# Altium footprint library connecteurs.PcbLib: 162 footprints (part 2 of 11)
Each footprint in its own frame and in the unit in brackets; x right, y up, seen from the top. Pads: shape width x height; smd on the part's side, far side on the other; paste and mask are expansions set on the pad; w line width, h text height; cw(c..) or ccw(c..) is an arc to the next point about the centre after c.
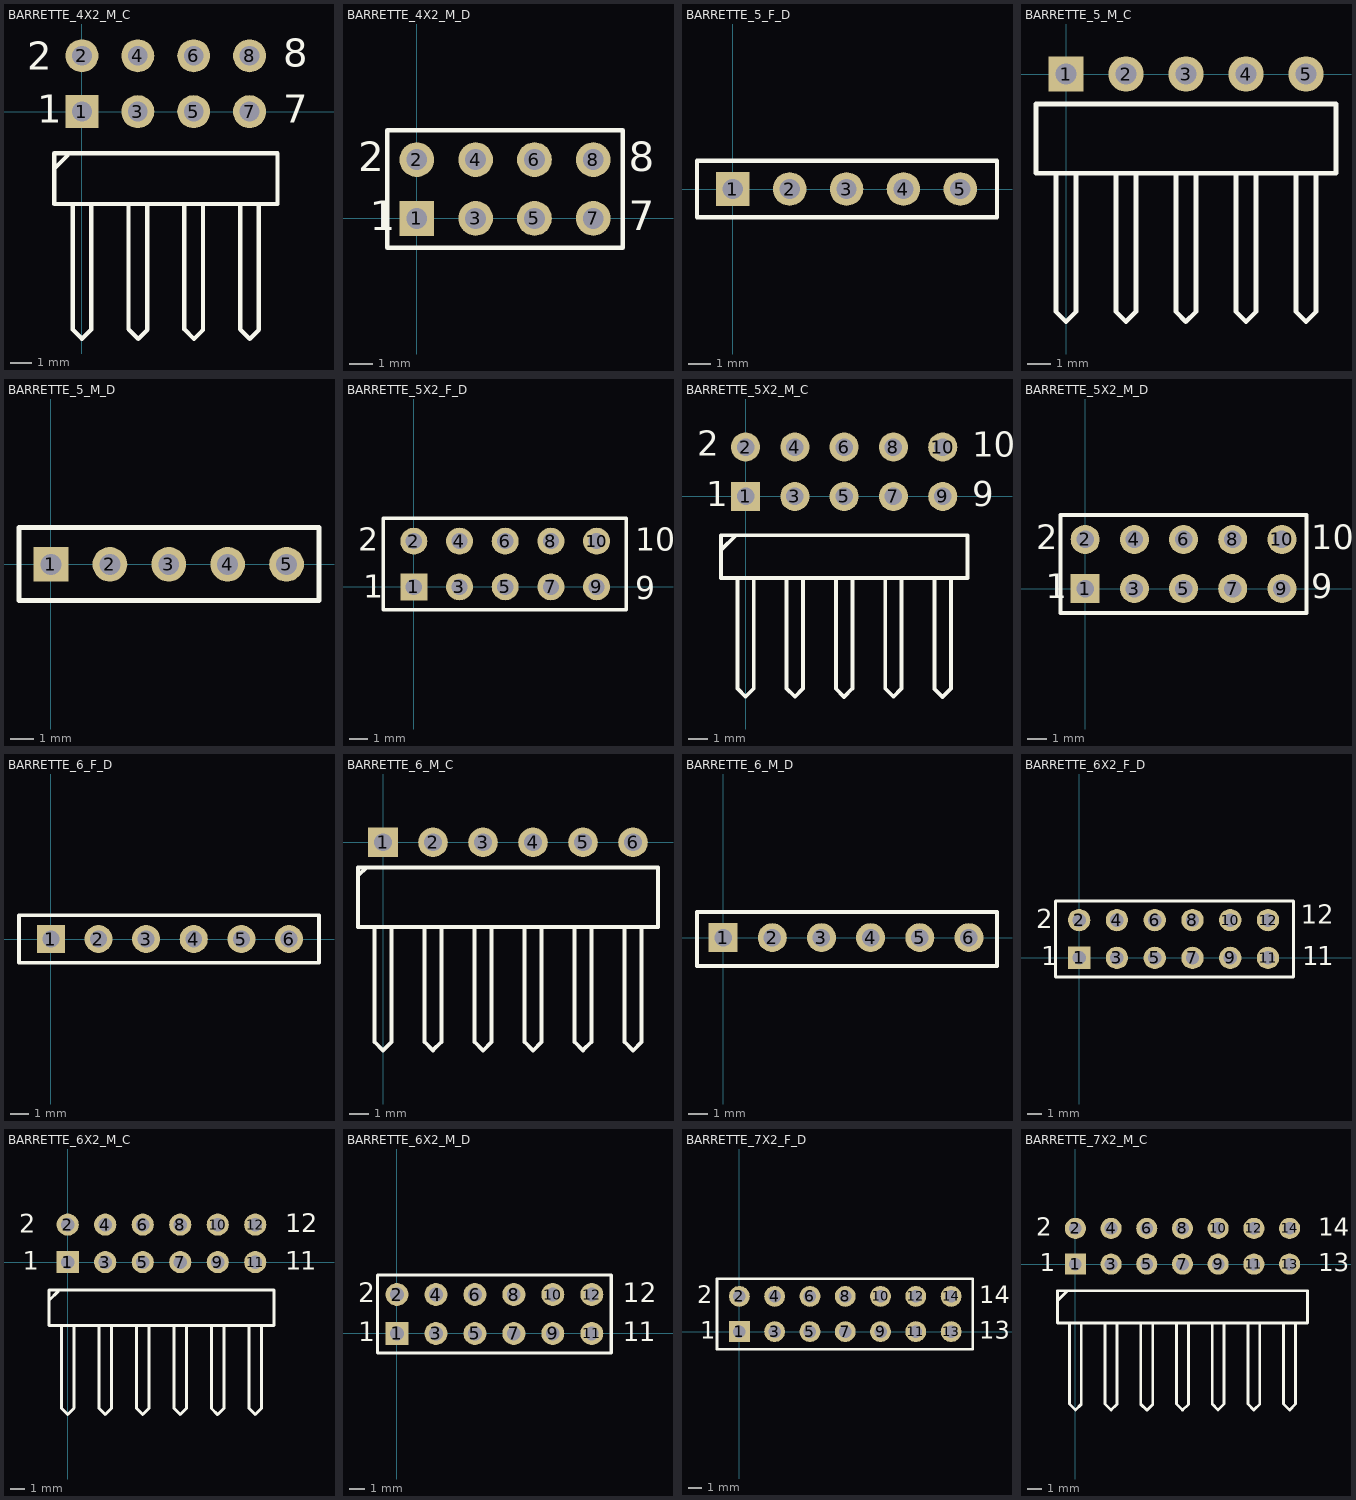
[diagram p1: the footprints below, top view; thin cyan lines are the x and y axes]

## BARRETTE_4X2_M_C [mm] "BARRETTE 4 CONTACTS ; 2 RANGEES ; COUDEE ; MALE ; ESPACEMENT BROCHES = 2.54 mm"
height 5
pads (8):
  rect 1.5x1.5 hole 0.9: 1(0,0)
  round 1.5 hole 0.9: 2(0,2.54) 3(2.54,0) 4(2.54,2.54) 5(5.08,0) 6(5.08,2.54) 7(7.62,0) 8(7.62,2.54)
Top Overlay:
  lines w0.2: -1.27,-2.605 -0.635,-1.97 ; -0.423,-9.907 0,-10.33 ; -0.423,-9.9 -0.423,-4.2 ; -0.003,-10.333 0.42,-9.91 ; 0.423,-9.89 0.423,-4.2 ; 2.117,-9.9 2.117,-4.2 ; 2.12,-9.9 2.555,-10.335 2.963,-9.927 2.963,-4.2 ; 4.657,-9.9 4.657,-4.2 ; 4.66,-9.9 5.095,-10.335 ; 5.092,-10.338 5.5,-9.93 ; 5.503,-9.9 5.503,-4.2 ; 7.195,-9.905 7.63,-10.34 ; 7.197,-9.9 7.197,-4.2 ; 7.632,-10.338 8.043,-9.927 8.043,-4.2 ; -1.27,-4.2 8.89,-4.2 8.89,-1.9 -1.27,-1.9 -1.27,-4.2
  text "2" at -2.5,1.9 h1.27
  text "1" at -2.032,-0.508 h1.27
  text "7" at 9.144,-0.508 h1.27
  text "8" at 9.144,2.032 h1.27
3D body: height 5.64, standoff -2.23, extent -1.3,-9.9 8.86,2.863

## BARRETTE_4X2_M_D [mm] "BARRETTE 4 CONTACTS ; 2 RANGEES ; DROITE ; MALE ; ESPACEMENT BROCHES = 2.54 mm"
height 9.6
pads (8):
  rect 1.5x1.5 hole 0.9: 1(0,0)
  round 1.5 hole 0.9: 2(0,2.54) 3(2.54,0) 4(2.54,2.54) 5(5.08,0) 6(5.08,2.54) 7(7.62,0) 8(7.62,2.54)
Top Overlay:
  lines w0.2: -1.27,-1.27 -1.27,3.81 8.89,3.81 8.89,-1.27 -1.27,-1.27
  text "8" at 9.144,2.032 h1.27
  text "7" at 9.144,-0.508 h1.27
  text "1" at -2.032,-0.508 h1.27
  text "2" at -2.54,2.032 h1.27
3D body: height 10.67, standoff -2.79, extent -1.3,-1.3 8.86,3.78

## BARRETTE_5_F_D [mm] "BARRETTE 5 CONTACTS ; 1 RANGEE ; DROITE ; FEMELLE ; ESPACEMENT BROCHES = 2.54 mm"
height 8.6
pads (5):
  rect 1.5x1.5 hole 0.9: 1(0,0)
  round 1.5 hole 0.9: 2(2.54,0) 3(5.08,0) 4(7.62,0) 5(10.16,0)
Top Overlay:
  lines w0.2: -1.6,-1.27 11.8,-1.27 11.8,1.27 -1.6,1.27 -1.6,-1.27
3D body: height 8.5, standoff -2.65, extent -1.504,-1.2 11.704,1.213

## BARRETTE_5_M_C [mm] "BARRETTE 5 CONTACTS ; 1 RANGEE ; COUDEE ; MALE ; ESPACEMENT BROCHES = 2.54 mm"
height 2.5
pads (5):
  rect 1.5x1.5 hole 0.9: 1(0,0)
  round 1.5 hole 0.9: 2(2.54,0) 3(5.08,0) 4(7.62,0) 5(10.16,0)
Top Overlay:
  lines w0.2: -0.423,-10.06 -0.423,-4.22 ; -0.423,-10.057 0,-10.48 0.423,-10.057 ; 0.423,-10.06 0.423,-4.2 ; 2.117,-10.057 2.54,-10.48 ; 2.117,-10.04 2.117,-4.22 ; 2.537,-10.483 2.96,-10.06 ; 2.963,-10.06 2.963,-4.22 ; 4.657,-4.22 4.657,-10.067 5.075,-10.485 5.503,-10.057 5.503,-4.22 ; 7.197,-10.06 7.197,-4.21 ; 7.197,-10.057 7.62,-10.48 8.043,-10.057 ; 8.043,-10.06 8.043,-4.23 ; 9.737,-10.06 9.737,-4.22 ; 9.737,-10.057 10.16,-10.48 10.583,-10.057 ; 10.583,-10.06 10.583,-4.22 ; -1.27,-4.2 11.43,-4.2 11.43,-1.27 -1.27,-1.27 -1.27,-4.2
3D body: height 2.55, standoff -1.95, extent -1.3,-10.06 11.4,0.26

## BARRETTE_5_M_D [mm] "BARRETTE 5 CONTACTS ; 1 RANGEE ; DROITE ; MALE ; ESPACEMENT BROCHES = 2.54 mm"
height 9.6
pads (5):
  rect 1.5x1.5 hole 0.9: 1(0,0)
  round 1.5 hole 0.9: 2(2.54,0) 3(5.08,0) 4(7.62,0) 5(10.16,0)
Top Overlay:
  lines w0.2: -1.38,-1.56 11.56,-1.56 11.56,1.59 -1.38,1.59 -1.38,-1.56
3D body: height 8.51, standoff -3.68, extent -1.25,-1.42 11.45,1.5

## BARRETTE_5X2_F_D [mm] "BARRETTE 5 CONTACTS ; 2 RANGEES ; DROITE ; FEMELLE ; ESPACEMENT BROCHES = 2.54 mm"
height 8.6
pads (10):
  rect 1.5x1.5 hole 0.9: 1(0,0)
  round 1.5 hole 0.9: 2(0,2.54) 3(2.54,0) 4(2.54,2.54) 5(5.08,0) 6(5.08,2.54) 7(7.62,0) 8(7.62,2.54) 9(10.16,0) 10(10.16,2.54)
Top Overlay:
  lines w0.2: -1.7,-1.27 11.8,-1.27 11.8,3.81 -1.7,3.81 -1.7,-1.27
  text "10" at 12.3,2 h1.27
  text "9" at 12.3,-0.7 h1.27
  text "1" at -2.8,-0.6 h1.27
  text "2" at -3.1,2 h1.27
3D body: height 8.5, standoff -2.65, extent -1.504,-1.253 11.704,3.7

## BARRETTE_5X2_M_C [mm] "BARRETTE 5 CONTACTS ; 2 RANGEES ; COUDEE ; MALE ; ESPACEMENT BROCHES = 2.54 mm"
height 5
pads (10):
  rect 1.5x1.5 hole 0.9: 1(0,0)
  round 1.5 hole 0.9: 2(0,2.54) 3(2.54,0) 4(2.54,2.54) 5(5.08,0) 6(5.08,2.54) 7(7.62,0) 8(7.62,2.54) 9(10.16,0) 10(10.16,2.54)
Top Overlay:
  lines w0.2: -1.235,-2.735 -0.5,-2 ; -0.423,-9.9 -0.423,-4.2 ; -0.42,-9.9 0.003,-10.323 ; 0,-10.32 0.423,-9.897 ; 0.423,-9.9 0.423,-4.2 ; 2.117,-9.9 2.117,-4.2 ; 2.12,-9.9 2.543,-10.323 ; 2.547,-10.323 2.97,-9.9 ; 2.963,-9.9 2.963,-4.2 ; 4.657,-4.2 4.657,-9.907 5.075,-10.325 5.5,-9.9 ; 5.503,-9.9 5.503,-4.2 ; 7.197,-9.9 7.197,-4.2 ; 7.2,-9.9 7.623,-10.323 ; 7.617,-10.323 8.04,-9.9 ; 8.043,-9.9 8.043,-4.243 ; 9.737,-4.2 9.737,-9.927 10.145,-10.335 10.58,-9.9 ; 10.583,-9.9 10.583,-4.2 ; -1.27,-4.2 -1.27,-2 11.43,-2 11.43,-4.2 -1.27,-4.2
  text "10" at 11.684,2.032 h1.27
  text "9" at 11.684,-0.508 h1.27
  text "1" at -2.032,-0.508 h1.27
  text "2" at -2.5,2.1 h1.27
3D body: height 5.64, standoff -2.23, extent -1.3,-9.9 11.4,2.863

## BARRETTE_5X2_M_D [mm] "BARRETTE 5 CONTACTS ; 2 RANGEES ; DROITE ; MALE ; ESPACEMENT BROCHES = 2.54 mm"
height 9.6
pads (10):
  rect 1.5x1.5 hole 0.9: 1(0,0)
  round 1.5 hole 0.9: 2(0,2.54) 3(2.54,0) 4(2.54,2.54) 5(5.08,0) 6(5.08,2.54) 7(7.62,0) 8(7.62,2.54) 9(10.16,0) 10(10.16,2.54)
Top Overlay:
  lines w0.2: -1.27,-1.27 -1.27,3.81 11.43,3.81 11.43,-1.27 -1.27,-1.27
  text "2" at -2.54,2.032 h1.27
  text "1" at -2.032,-0.508 h1.27
  text "9" at 11.684,-0.508 h1.27
  text "10" at 11.684,2.032 h1.27
3D body: height 10.67, standoff -2.79, extent -1.3,-1.24 11.4,3.84

## BARRETTE_6_F_D [mm] "BARRETTE 6 CONTACTS ; 1 RANGEE ; DROITE ; FEMELLE ; ESPACEMENT BROCHES = 2.54 mm"
height 8.6
pads (6):
  rect 1.5x1.5 hole 0.9: 1(0,0)
  round 1.5 hole 0.9: 2(2.54,0) 3(5.08,0) 4(7.62,0) 5(10.16,0) 6(12.7,0)
Top Overlay:
  lines w0.2: -1.7,-1.27 -1.7,1.27 14.3,1.27 14.3,-1.27 -1.7,-1.27
3D body: height 8.5, standoff -2.65, extent -1.574,-1.2 14.174,1.213

## BARRETTE_6_M_C [mm] "BARRETTE 6 CONTACTS ; 1 RANGEE ; COUDEE ; MALE ; ESPACEMENT BROCHES = 2.54 mm"
height 2.5
pads (6):
  rect 1.5x1.5 hole 0.9: 1(0,0)
  round 1.5 hole 0.9: 2(2.54,0) 3(5.08,0) 4(7.62,0) 5(10.16,0) 6(12.7,0)
Top Overlay:
  lines w0.2: -1.27,-1.693 -0.847,-1.27 ; -0.423,-10.14 -0.423,-4.33 ; -0.42,-10.14 0.005,-10.565 0.423,-10.147 0.423,-4.3 ; 2.117,-10.14 2.117,-4.31 ; 2.12,-10.14 2.545,-10.565 ; 2.542,-10.558 2.96,-10.14 ; 2.963,-10.14 2.963,-4.33 ; 4.657,-10.14 4.657,-4.31 ; 4.66,-10.14 5.085,-10.565 ; 5.092,-10.568 5.51,-10.15 ; 5.503,-10.14 5.503,-4.31 ; 7.197,-10.14 7.197,-4.31 ; 7.2,-10.14 7.625,-10.565 ; 7.632,-10.568 8.05,-10.15 ; 8.043,-10.14 8.043,-4.29 ; 9.737,-10.14 9.737,-4.33 ; 9.74,-10.14 10.165,-10.565 ; 10.162,-10.558 10.58,-10.14 ; 10.583,-10.14 10.583,-4.3 ; 12.277,-10.14 12.277,-4.31 ; 12.28,-10.14 12.705,-10.565 ; 12.712,-10.568 13.13,-10.15 ; 13.123,-10.14 13.123,-4.33 ; -1.27,-4.29 -1.27,-1.27 13.97,-1.27 13.97,-4.29 -1.27,-4.29
3D body: height 3.18, standoff -2.2, extent -1.27,-10.14 13.97,0.34

## BARRETTE_6_M_D [mm] "BARRETTE 6 CONTACTS ; 1 RANGEE ; DROITE ; MALE ; ESPACEMENT BROCHES = 2.54 mm"
height 9.6
pads (6):
  rect 1.5x1.5 hole 0.9: 1(0,0)
  round 1.5 hole 0.9: 2(2.54,0) 3(5.08,0) 4(7.62,0) 5(10.16,0) 6(12.7,0)
Top Overlay:
  lines w0.2: -1.35,-1.46 14.15,-1.46 14.15,1.32 -1.35,1.32 -1.35,-1.46
3D body: height 10.1, standoff -1.5, extent -1.22,-1.34 14.02,1.2

## BARRETTE_6X2_F_D [mm] "BARRETTE 6 CONTACTS ; 2 RANGEES ; DROITE ; FEMELLE ; ESPACEMENT BROCHES = 2.54 mm"
height 8.6
pads (12):
  rect 1.5x1.5 hole 0.9: 1(0,0)
  round 1.5 hole 0.9: 2(0,2.54) 3(2.54,0) 4(2.54,2.54) 5(5.08,0) 6(5.08,2.54) 7(7.62,0) 8(7.62,2.54) 9(10.16,0) 10(10.16,2.54) 11(12.7,0) 12(12.7,2.54)
Top Overlay:
  lines w0.2: -1.6,-1.27 -1.6,3.81 14.4,3.81 14.4,-1.27 -1.6,-1.27
  text "2" at -2.9,2 h1.27
  text "1" at -2.54,-0.508 h1.27
  text "1" at 15,-0.5 h1.27
  text "1" at 16,-0.5 h1.27
  text "12" at 14.9,2.3 h1.27
3D body: height 8.5, standoff -2.65, extent -1.444,-1.14 14.304,3.813

## BARRETTE_6X2_M_C [mm] "BARRETTE 6 CONTACTS ; 2 RANGEES ; COUDEE ; MALE ; ESPACEMENT BROCHES = 2.54 mm"
height 5
pads (12):
  rect 1.5x1.5 hole 0.9: 1(0,0)
  round 1.5 hole 0.9: 2(0,2.54) 3(2.54,0) 4(2.54,2.54) 5(5.08,0) 6(5.08,2.54) 7(7.62,0) 8(7.62,2.54) 9(10.16,0) 10(10.16,2.54) 11(12.7,0) 12(12.7,2.54)
Top Overlay:
  lines w0.2: -1.27,-2.605 -0.635,-1.97 ; -0.423,-4.3 -0.423,-9.897 -0.003,-10.317 0.423,-9.89 0.423,-4.3 ; 2.117,-4.3 2.117,-9.9 2.537,-10.32 ; 2.537,-10.327 2.963,-9.9 2.963,-4.3 ; 4.657,-4.4 4.657,-9.9 5.077,-10.32 ; 5.077,-10.327 5.503,-9.9 5.503,-4.3 ; 7.197,-4.3 7.197,-9.9 7.617,-10.32 ; 7.617,-10.327 8.043,-9.9 8.043,-4.3 ; 9.737,-4.3 9.737,-9.91 10.157,-10.33 ; 10.157,-10.327 10.583,-9.9 10.583,-4.3 ; 12.277,-4.3 12.277,-9.9 12.697,-10.32 ; 12.697,-10.327 13.123,-9.9 13.123,-4.3 ; -1.27,-4.3 13.97,-4.3 13.97,-1.9 -1.27,-1.9 -1.27,-4.3
  text "2" at -3.3,2 h1.27
  text "1" at -3.048,-0.508 h1.27
  text "1" at 14.732,-0.508 h1.27
  text "1" at 15.748,-0.508 h1.27
  text "12" at 14.732,2.032 h1.27
3D body: height 5.64, standoff -2.23, extent -1.3,-9.9 13.94,2.863

## BARRETTE_6X2_M_D [mm] "BARRETTE 6 CONTACTS ; 2 RANGEES ; DROITE ; MALE ; ESPACEMENT BROCHES = 2.54 mm"
height 9.6
pads (12):
  rect 1.5x1.5 hole 0.9: 1(0,0)
  round 1.5 hole 0.9: 2(0,2.54) 3(2.54,0) 4(2.54,2.54) 5(5.08,0) 6(5.08,2.54) 7(7.62,0) 8(7.62,2.54) 9(10.16,0) 10(10.16,2.54) 11(12.7,0) 12(12.7,2.54)
Top Overlay:
  lines w0.2: -1.27,-1.27 13.97,-1.27 13.97,3.81 -1.27,3.81 -1.27,-1.27
  text "12" at 14.732,2.032 h1.27
  text "1" at 15.748,-0.508 h1.27
  text "1" at 14.732,-0.508 h1.27
  text "1" at -2.54,-0.508 h1.27
  text "2" at -2.54,2.032 h1.27
3D body: height 10.67, standoff -2.79, extent -1.3,-1.24 13.94,3.84

## BARRETTE_7X2_F_D [mm] "BARRETTE 7 CONTACTS ; 2 RANGEES ; DROITE ; FEMELLE ; ESPACEMENT BROCHES = 2.54 mm"
height 8.6
pads (14):
  rect 1.5x1.5 hole 0.9: 1(0,0)
  round 1.5 hole 0.9: 2(0,2.54) 3(2.54,0) 4(2.54,2.54) 5(5.08,0) 6(5.08,2.54) 7(7.62,0) 8(7.62,2.54) 9(10.16,0) 10(10.16,2.54) 11(12.7,0) 12(12.7,2.54) 13(15.24,0) 14(15.24,2.54)
Top Overlay:
  lines w0.2: -1.6,-1.27 16.8,-1.27 16.8,3.81 -1.6,3.81 -1.6,-1.27
  text "13" at 17.272,-0.508 h1.27
  text "14" at 17.272,2.032 h1.27
  text "1" at -2.8,-0.5 h1.27
  text "2" at -3.048,2.032 h1.27
3D body: height 8.5, standoff -2.65, extent -1.544,-1.2 16.744,3.753

## BARRETTE_7X2_M_C [mm] "BARRETTE 7 CONTACTS ; 2 RANGEES ; COUDEE ; MALE ; ESPACEMENT BROCHES = 2.54 mm"
height 5
pads (14):
  rect 1.5x1.5 hole 0.9: 1(0,0)
  round 1.5 hole 0.9: 2(0,2.54) 3(2.54,0) 4(2.54,2.54) 5(5.08,0) 6(5.08,2.54) 7(7.62,0) 8(7.62,2.54) 9(10.16,0) 10(10.16,2.54) 11(12.7,0) 12(12.7,2.54) 13(15.24,0) 14(15.24,2.54)
Top Overlay:
  lines w0.2: -1.27,-2.605 -0.635,-1.97 ; -0.423,-4.2 -0.423,-9.95 0.008,-10.382 ; 0.01,-10.383 0.423,-9.97 0.423,-4.2 ; 2.117,-4.2 2.117,-9.95 2.548,-10.382 2.963,-9.967 2.963,-4.2 ; 4.657,-4.2 4.657,-9.97 5.088,-10.402 5.503,-9.987 5.503,-4.2 ; 7.197,-4.2 7.197,-9.96 7.628,-10.392 8.043,-9.977 8.043,-4.2 ; 9.737,-4.2 9.737,-9.96 10.153,-10.377 10.583,-9.947 10.583,-4.3 ; 12.277,-4.2 12.277,-9.96 12.693,-10.377 ; 12.708,-10.365 13.123,-9.95 13.123,-4.2 ; 14.817,-4.2 14.817,-9.96 15.233,-10.377 ; 15.248,-10.375 15.663,-9.96 15.663,-4.2 ; -1.27,-4.2 16.51,-4.2 16.51,-1.9 -1.27,-1.9 -1.27,-4.2
  text "14" at 17.272,2.032 h1.27
  text "13" at 17.272,-0.508 h1.27
  text "1" at -2.54,-0.508 h1.27
  text "2" at -2.8,2 h1.27
3D body: height 5.64, standoff -2.23, extent -1.24,-9.96 16.54,2.803